# Altium footprint library AHMET_CAN_KARACAN.PcbL.PcbLib: 65 footprints (part 2 of 5)
Each footprint in its own frame and in the unit in brackets; x right, y up, seen from the top. Pads: shape width x height; smd on the part's side, far side on the other; paste and mask are expansions set on the pad; w line width, h text height; cw(c..) or ccw(c..) is an arc to the next point about the centre after c.
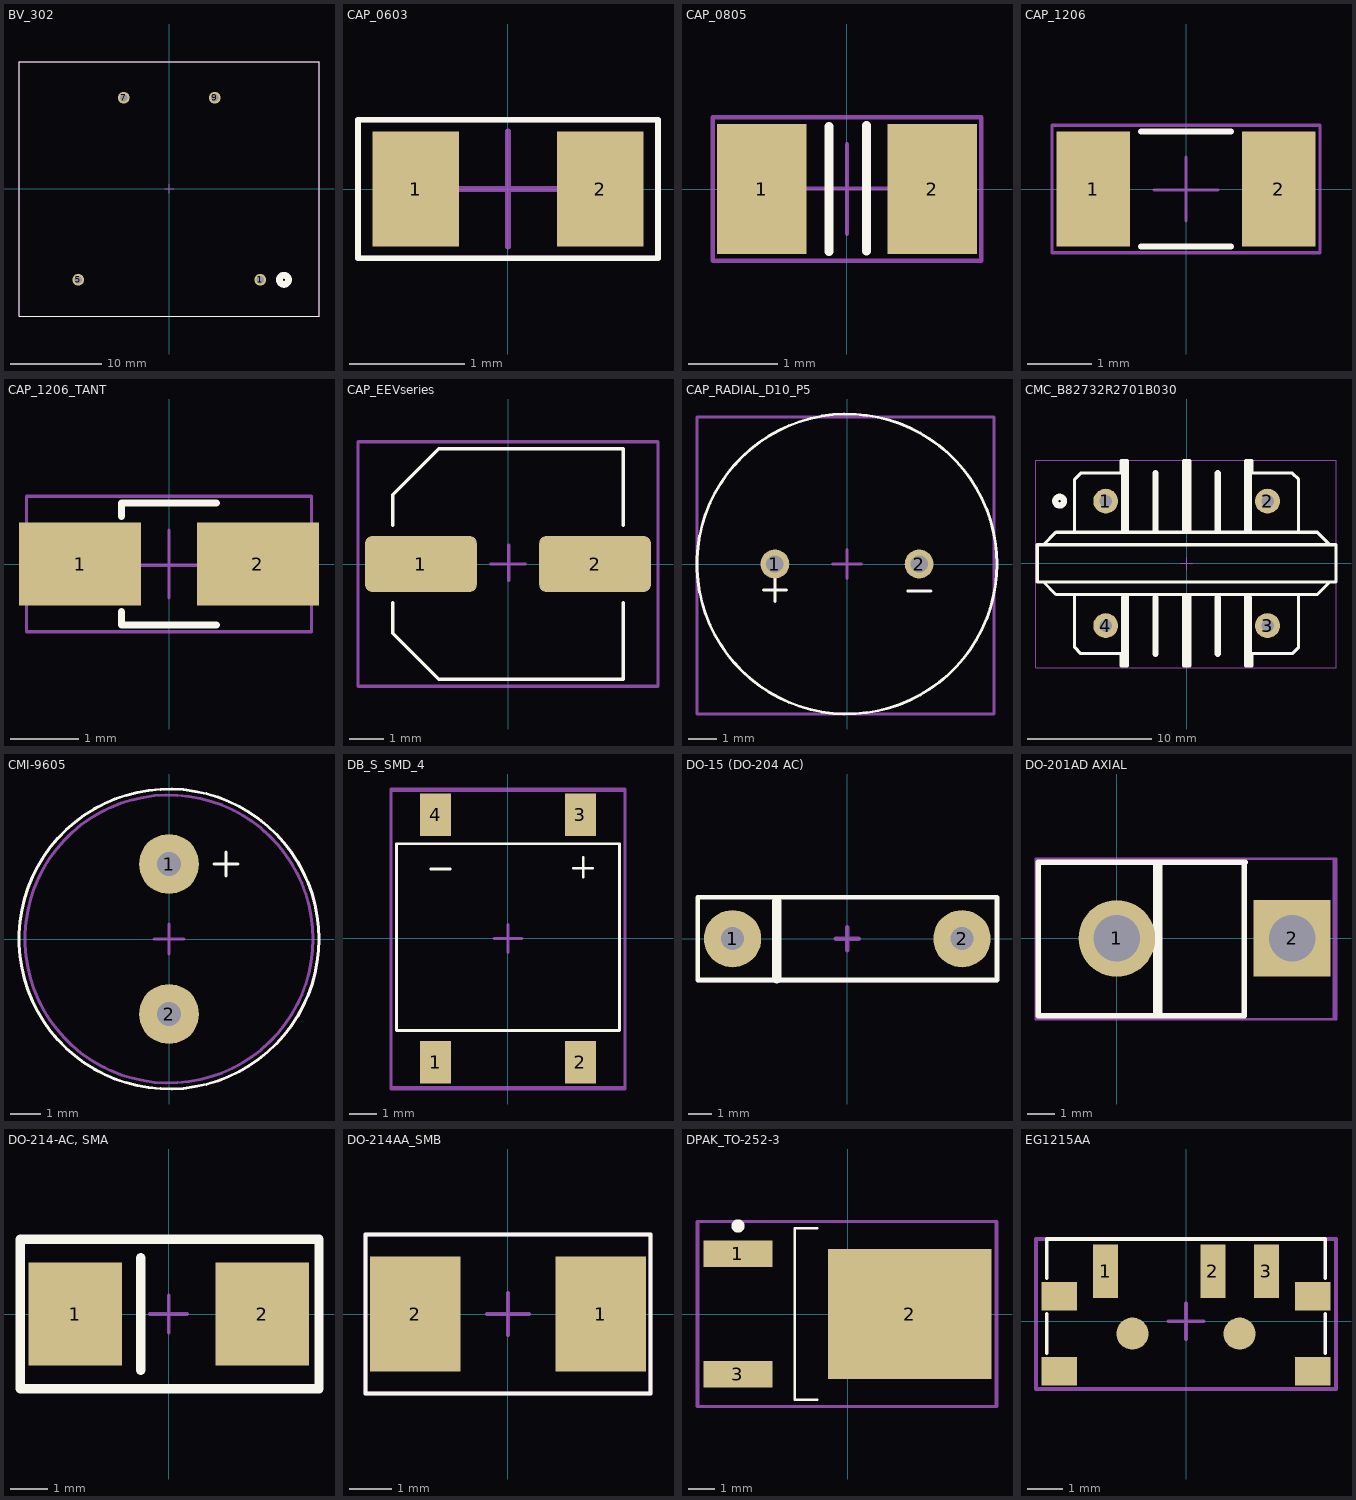
[diagram p1: the footprints below, top view; thin cyan lines are the x and y axes]

## BV_302 [mm]
pads (4):
  round 1.28 hole 0.8 mask+0.05: 1(10,-10) 5(-10,-10) 7(-5,10) 9(5,10)
Top Overlay:
  circle w0.75: c12.6,-10 r0.5
  lines w0.1: -16.5,-13.975 16.45,-13.975 16.45,13.95 -16.475,13.95 -16.5,13.95 -16.5,-13.975
Top Component Center:
  lines w0.1: -0.5,0 0.5,0 ; 0,-0.5 0,0.5 ; -16.475,-13.975 16.45,-13.975 16.45,13.95 -16.475,13.95 -16.475,-13.975
Top Designator:
  lines w0.1: -16.475,-14 16.45,-14 16.45,13.925 16.45,13.95 -16.475,13.95 -16.475,-14
  text ".Designator" at -3.3,-0.167 h2.5
3D body "BV301_BV302 .step": height 4, standoff -16.5, extent -16.4,-13.9 16.4,13.9

## CAP_0603 [mm]
pads (2):
  rect 0.75x1 smd mask+0.05: 1(-0.8,0) 2(0.8,0)
Top Overlay:
  lines w0.05: -1.3,-0.6 -1.3,0.6 1.3,0.6 1.3,-0.6 -1.3,-0.6
Top Component Center:
  lines w0.05: -0.5,0 0.5,0 ; 0,-0.5 0,0.5 ; -1.3,-0.6 -1.3,0.6 1.3,0.6 1.3,-0.6 -1.3,-0.6
Top Designator:
  lines w0.05: -1.3,-0.6 -1.3,0.6 1.3,0.6 1.3,-0.6 -1.3,-0.6
  text ".Designator" at -0.6,-0.133 h0.5
3D body "CAPC0603.STEP": height 0.8, standoff 0, extent -1.05,-0.52 1.05,0.509

## CAP_0805 [mm]
pads (2):
  rect 1x1.45 smd mask+0.05: 1(-0.95,0) 2(0.95,0)
Top Overlay:
  lines w0.1: -0.2,-0.7 -0.2,0.7 ; 0.216,-0.692 0.216,0.708
Top Component Center:
  lines w0.05: -0.487,0.006 0.513,0.006 ; 0,-0.5 0,0.5 ; -1.5,-0.8 1.5,-0.8 1.5,0.8 -1.5,0.8 -1.5,-0.8
Top Designator:
  lines w0.05: -1.5,-0.8 1.5,-0.8 1.5,0.8 -1.5,0.8 -1.5,-0.8
3D body "CAPC0805.STEP": height 0.9, standoff 0, extent -1.301,-0.678 1.301,0.678

## CAP_1206 [mm]
pads (2):
  rect 1.15x1.8 smd mask+0.05: 1(-1.45,0) 2(1.45,0)
Top Overlay:
  lines w0.1: -0.7,-0.9 0.7,-0.9 ; -0.7,0.9 0.7,0.9
Top Component Center:
  lines w0.05: -0.499,-0.017 0.501,-0.017 ; 0,-0.5 0,0.5 ; -2.1,-1 -2.1,1 2.1,1 2.1,-1 -2.1,-1
Top Designator:
  lines w0.05: -2.1,-1 -2.1,1 2.1,1 2.1,-1 -2.1,-1
  text ".Designator" at -0.4,-0.133 h0.5
3D body "CAPC1206.STEP": height 1.3, standoff -0.01, extent -1.975,-0.976 1.975,0.976

## CAP_1206_TANT [mm]
pads (2):
  rect 1.8x1.23 smd mask+0.05: 1(-1.31,0) 2(1.31,0)
Top Overlay:
  lines w0.1: -0.7,-0.7 -0.7,-0.9 0.7,-0.9 ; -0.7,0.7 -0.7,0.9 0.7,0.9
Top Component Center:
  lines w0.05: -0.499,-0.017 0.501,-0.017 ; 0,-0.5 0,0.5 ; -2.1,-1 -2.1,1 2.1,1 2.1,-1 -2.1,-1
Top Designator:
  lines w0.05: -2.1,-1 -2.1,1 2.1,1 2.1,-1 -2.1,-1
  text ".Designator" at -0.4,-0.133 h0.5
3D body "CAP_TAN_1206.step": height 1.81, standoff 0, extent -1.7,-0.9 1.7,0.9

## CAP_EEVseries [mm] "6.6x6.6"
pads (2):
  rrect25% 3.2x1.6 smd mask+0.05: 1(-2.495,0) 2(2.495,0)
Top Overlay:
  lines w0.1: -3.3,-1.11 -3.3,-1.98 -1.98,-3.3 3.3,-3.3 3.3,-1.11 ; -3.3,1.11 -3.3,1.98 -1.98,3.3 3.3,3.3 3.3,1.11
Top Component Center:
  lines w0.1: -0.5,0 0.5,0 ; 0.027,-0.469 0.027,0.531 ; -4.3,-3.5 -4.3,3.5 4.3,3.5 4.3,-3.5 -4.3,-3.5
Top Designator:
  lines w0.1: -4.3,-3.5 -4.3,3.5 4.3,3.5 4.3,-3.5 -4.3,-3.5
  text ".Designator" at -1.371,-0.638 h1.52
3D body "Radial Can SMD 6.6x6.6.step": height 8.05, standoff 0, extent -3.899,-3.407 3.899,3.4

## CAP_RADIAL_D10_P5 [mm]
pads (2):
  round 1 hole 0.6 mask+0.05: 1(-2.5,0) 2(2.5,0)
Top Overlay:
  circle w0.1: c0,0 r5.2
  lines w0.1: -2.9,-0.9 -2.1,-0.9 ; -2.5,-1.3 -2.5,-0.5 ; 2.106,-0.934 2.906,-0.934
Top Component Center:
  lines w0.1: -0.5,0 0.5,0 ; 0,-0.5 0,0.5 ; -5.2,-5.2 5.1,-5.2 5.1,5.1 -5.2,5.1 -5.2,-5.2
Top Designator:
  lines w0.1: -5.2,-5.2 5.1,-5.2 5.1,5.1 -5.2,5.1 -5.2,-5.2
  text ".Designator" at -1.646,-0.538 h1.52
3D body: height 20.2, standoff 0.2, extent -5.046,-5.032 4.954,4.968
3D body: height 0.3, standoff -20, extent -2.8,-0.3 -2.2,0.3
3D body: height 0.3, standoff -15, extent 2.2,-0.3 2.8,0.3

## CMC_B82732R2701B030 [mm]
pads (4):
  round 2 hole 1: 1(-6.5,5) 2(6.5,5) 3(6.5,-5) 4(-6.5,-5)
Top Overlay:
  circle w0.5: c-10.2,5 r0.35
  lines w0.254: -11.5,-1.5 -10.5,-2.5 10.5,-2.5 11.5,-1.5 ; -11.5,1.5 -10.5,2.5 10.5,2.5 11.5,1.5 ; -9.25,2.5 9.25,2.5 ; -9,-2.5 -9,-6.75 -8.5,-7.25 -5.25,-7.25 -5.25,-8.25 -4.75,-8.25 -4.75,-2.5 ; -9,2.5 -9,6.75 -8.5,7.25 -5.25,7.25 -5.25,8.25 -4.75,8.25 -4.75,2.5 ; -0.25,-2.5 -0.25,-8.25 0.25,-8.25 0.25,-2.5 ; -0.25,2.5 -0.25,8.25 0.25,8.25 0.25,2.5 ; 4.75,-2.5 4.75,-8.25 5.25,-8.25 5.25,-7.25 8.5,-7.25 9,-6.75 9,-2.5 ; 4.75,2.5 4.75,8.25 5.25,8.25 5.25,7.25 8.5,7.25 9,6.75 9,2.5 ; -12,-1.5 12,-1.5 12,1.5 -12,1.5 -12,-1.5
  lines w0.508: -5,-8 -5,-2.75 ; -5,2.75 -5,8 ; -2.5,-7.25 -2.5,-2.75 ; -2.5,2.75 -2.5,7.25 ; 0,-8 0,-2.75 ; 0,2.75 0,8 ; 2.5,-7.25 2.5,-2.75 ; 2.5,2.75 2.5,7.25 ; 5,-8 5,-2.75 ; 5,2.75 5,8
Top Component Center:
  lines w0.1: -0.5,0 0.5,0 ; 0,-0.5 0,0.5 ; -12.1,-8.4 12,-8.4 12,8.3 -12.1,8.3 -12.1,-8.4
Top Designator:
  lines w0.1: -12.1,-8.4 -12.1,8.3 12,8.3 12,-8.4 -12.1,-8.4
  text ".Designator" at -0.65,-0.283 h0.8
3D body "B82732R2701B030.stp": height 23.6, standoff -2.9, extent -12.048,-8.254 11.952,8.246

## CMI-9605 [mm]
pads (2):
  round 2 hole 0.8 mask+0.05: 1(0,2.5) 2(0,-2.5)
Top Overlay:
  circle w0.1: c0,0 r5
  lines w0.1: 1.5,2.5 2.3,2.5 ; 1.9,2.1 1.9,2.9
Top Component Center:
  circle w0.1: c0,0 r4.8
  lines w0.1: -0.5,0 0.5,0 ; 0,-0.5 0,0.5
Top Designator:
  circle w0.1: c0,0 r4.8
  text ".Designator" at -1.046,-0.313 h1
3D body: height 5.1, standoff 0.1, extent -4.818,-4.812 4.782,4.788
3D body: height 0.15, standoff -5.35, extent -0.332,2.17 0.268,2.77
3D body: height 0.15, standoff -3.85, extent -0.3,-2.8 0.3,-2.2
3D body: height 5.16, standoff 5.11, extent -4,-4 4,4
3D body: height 5.16, standoff 5.11, extent -1.8,2.6 1.8,6.2

## DB_S_SMD_4 [mm]
pads (4):
  rect 1.1x1.52 smd mask+0.05: 1(-2.6,-4.44) 2(2.6,-4.44) 3(2.6,4.44) 4(-2.6,4.44)
Top Overlay:
  lines w0.1: -2.771,2.491 -2.071,2.491 ; 2.338,2.519 3.038,2.519 ; 2.7,2.2 2.7,2.9 ; -4,-3.3 4,-3.3 4,3.4 -4,3.4 -4,-3.3
Top Component Center:
  lines w0.1: -0.5,0 0.5,0 ; 0,-0.5 0,0.5 ; -4.2,-5.34 -4.2,5.36 4.2,5.36 4.2,-5.34 -4.2,-5.34
Top Designator:
  lines w0.1: -4.2,-5.4 -4.2,5.3 4.2,5.3 4.2,-5.4 -4.2,-5.4
  text ".Designator" at -1.146,-0.713 h1
3D body "DB107S--3DModel-STEP-56544.STEP": height 2.7, standoff 0, extent -4.075,-4.89 4.075,5.01

## DO-15 (DO-204 AC) [mm]
pads (2):
  round 2.5 hole 1: 1(-5,0) 2(5,0)
Top Overlay:
  lines w0.2: -6.525,-1.8 -6.525,1.8 6.525,1.8 6.525,-1.8 -6.525,-1.8
  lines w0.4: -3.075,-1.75 -3.075,1.625
Top Component Center:
  lines w0.1: -6.5,-1.775 -6.5,1.825 6.5,1.825 6.5,-1.775 -6.5,-1.775
  lines w0.2: -0.5,0 0.5,0 ; 0,-0.5 0,0.5
Top Designator:
  lines w0.1: -6.55,-1.85 -6.55,1.825 6.525,1.825 6.525,-1.85 -6.55,-1.85
  text ".Designator" at -0.775,-0.233 h0.8
3D body "DO41.STEP": height 2.84, standoff -2.52, extent -5.447,-1.337 5.412,1.388

## DO-201AD AXIAL [mm]
pads (2):
  round 2.8 hole 1.7: 1(0,0)
  rect 2.8x2.8 hole 1.7: 2(6.397,0)
Top Overlay:
  lines w0.2: -2.874,-2.825 -2.874,2.775 4.696,2.775 4.645,2.775 4.645,-2.825 -2.874,-2.825
  lines w0.35: 1.5,-2.75 1.5,2.673
Top Component Center:
  lines w0.1: -0.5,0 0.5,0 ; 0,-0.5 0,0.5 ; -2.951,-2.95 8,-2.95 8,2.9 -2.951,2.9 -2.951,-2.95
Top Designator:
  lines w0.1: -2.951,-2.95 -2.951,2.9 7.924,2.9 7.924,-2.95 -2.951,-2.95
  text ".Designator" at -1,-0.233 h0.8
3D body "User Library-User Library-DO-201AV-Vertical_2001.STEP": height 15.69, standoff -3, extent -2.815,-2.845 7.075,2.755

## DO-214-AC, SMA [mm]
pads (2):
  rect 2.5x2.743 smd: 1(-2.5,0) 2(2.5,0)
Top Overlay:
  lines w0.25: -0.75,-1.5 -0.75,1.5 ; -3.967,-2 4.018,-2 4.018,2 -3.967,2 -3.967,0 -3.967,-2
Top Component Center:
  lines w0.1: -0.5,0 0.5,0 ; 0,-0.5 0,0.5 ; -4,-2 -4,2 4,2 4,-2 -4,-2
Top Designator:
  lines w0.1: -4,-2 -4,2 4,2 4,-2 -4,-2
  text ".Designator" at -0.75,-0.233 h0.8
3D body "DO214AA.step": height 2.27, standoff -0.03, extent -2.7,-1.8 2.7,1.8

## DO-214AA_SMB [mm]
pads (2):
  rect 2.159x2.743 smd mask+0.05: 1(2.21,0) 2(-2.21,0)
Top Overlay:
  lines w0.1: -3.4,-1.9 -3.4,1.9 3.4,1.9 3.4,-1.9 -3.4,-1.9
Top Component Center:
  lines w0.1: -0.5,0 0.5,0 ; 0,-0.5 0,0.5 ; -3.4,-1.9 3.4,-1.9 3.4,1.9 -3.4,1.9 -3.4,-1.9
Top Designator:
  lines w0.1: -3.4,-1.9 3.4,-1.9 3.4,1.9 -3.4,1.9 -3.4,-1.9
  text ".Designator" at -0.746,-0.413 h1
3D body "DO-214AA SMB.step": height 2.3, standoff 0, extent -2.7,-1.8 2.7,1.8

## DPAK_TO-252-3 [mm] "D-PAK, 3-Pads, Body 6,15x6,61mm (max), IPC Medium Density"
height 2.3
pads (3):
  rect 2.6x1 smd: 1(-4.15,2.28) 3(-4.15,-2.28)
  rect 6.2x4.9 smd: 2(2.35,0)
Top Overlay:
  circle w0.25: c-4.15,3.33 r0.125
  lines w0.1: -1.15,-3.25 -2,-3.25 -2,3.25 -1.15,3.25
Top Component Center:
  lines w0.1: -0.5,0 0.5,0 ; 0,-0.5 0,0.5 ; -5.65,-3.5 -5.65,3.5 5.65,3.5 5.65,-3.5 -5.65,-3.5
Top Designator:
  lines w0.1: -5.7,-3.5 5.6,-3.5 5.6,3.5 -5.7,3.5 -5.7,-3.5
  text ".Designator" at -2.4,-0.654 h2.54
3D body "DPAK_TO-252-3.step": height 3.3, standoff 0, extent -4.225,-3.25 5.5,3.25

## EG1215AA [mm]
pads (9):
  rect 0.7x1.5 smd mask+0.05: 1(-2.25,1.4) 2(0.75,1.4) 3(2.25,1.4)
  rect 1x0.8 smd mask+0.05: ""(-3.55,-1.4) ""(-3.55,0.7) ""(3.55,-1.4) ""(3.55,0.7)
  round 0.9 all layers, no hole mask+0.05: ""(-1.5,-0.35) ""(1.5,-0.35)
Top Overlay:
  lines w0.1: -3.9,-0.9 -3.9,0.2 ; -3.9,1.2 -3.9,2.3 -2.3,2.3 0.1,2.3 2.3,2.3 3.9,2.3 3.9,1.2 ; 3.9,-0.9 3.9,0.2
Top Component Center:
  lines w0.1: -0.5,0 0.5,0 ; 0,-0.5 0,0.5 ; -4.2,-1.9 4.2,-1.9 4.2,2.3 -4.2,2.3 -4.2,-1.9
Top Designator:
  lines w0.1: -4.2,-1.9 4.2,-1.9 4.2,2.3 -4.2,2.3 -4.2,-1.9
  text ".Designator" at -1.246,-0.738 h1.52
3D body "EG1215AA.STEP": height 1.5, standoff -0.2, extent -3.85,-3 3.85,1.9